# Altium integrated library Cap-El-THP_V2.IntLib: 241 symbols (part 1 of 2) (continued)
## 100uF_25V_20%
designator C?, comment value 100uF  Voltage: 25V  (hidden comment: CAP-EL_100uF_25V_20%)
Cap Electrolytic THP Radial; Manufacturer: Various; Tol: 20%; Part Number: CAP-EL_100uF_25V_20%; Package: EL-RAD-5x11; EDM-PN: *; Text2: *; Text1: *
footprint EL-RAD-5X11 (Capacitor, Electrolytic, THP, Radial, Dia 5.00mm, Pitch 2.0mm)
pins: 1, 2

## 100uF_25V_20%-EXR101M25B
designator C?, comment value 100uF  Voltage: 25V  (hidden comment: EXR101M25B)
Cap Electrolytic - Low Imp; Manufacturer: Hitano; Tol: 20%; Part Number: EXR101M25B; Package: EL-RAD-6.3x11; EDM-PN: *; Text2: *; Text1: *
footprint EL-RAD-6.3X11 (Capacitor, Electrolytic, THP, Radial, Dia 6.3mm, Pitch 2.5mm)
pins: 1, 2

## 100uF_35V_20%
designator C?, comment value 100uF  Voltage: 35V  (hidden comment: CAP-EL_100uF_35V_20%)
Cap Electrolytic THP Radial (6.3x11); Manufacturer: Various; EDM-PN: CAP32; Tol: 20%; Part Number: CAP-EL_100uF_35V_20%; Package: EL-RAD-6.3x11; Text2: *; Text1: *
footprint EL-RAD-6.3X11 (Capacitor, Electrolytic, THP, Radial, Dia 6.3mm, Pitch 2.5mm)
pins: 1, 2

## 100uF_35V_20%-6.3x12.5
designator C?, comment value 100uF  Voltage: 35V  (hidden comment: CAP-EL_100uF_35V_20% 6.3x12.5)
Cap Electrolytic THP Radial (6.3x12.5); Manufacturer: Various; Tol: 20%; Part Number: 100uF_35V_20% 6.3x12.5; Package: EL-RAD-6.3X12.5; EDM-PN: *; Text2: *; Text1: *
footprint EL-RAD-6.3X12.5 (Capacitor, Electrolytic, THP, Radial, Dia 6.3mm, Pitch 2.5mm)
pins: 1, 2

## 100uF_35V_20%-35PX100MEFC6.3X11
designator C?, comment value 100uF  Voltage: 35V  (hidden comment: 35PX100MEFC6.3X11)
Cap Electrolytic THP Radial; Manufacturer: Elna America; EDM-PN: CAP1303; Tol: 20%; Part Number: 35PX100MEFC6.3X11; Package: EL-RAD-5x11; Text2: *; Text1: *
footprint EL-RAD-6.3X11 (Capacitor, Electrolytic, THP, Radial, Dia 6.3mm, Pitch 2.5mm)
pins: 1, 2

## 100uF_35V_20%-LARGE
designator C?, comment value 100uF  Voltage: 35V  (hidden comment: CAP-EL_100uF_35V_20%)
Cap Electrolytic THP Radial (6.3x11); Manufacturer: Various; EDM-PN: CAP32; Tol: 20%; Part Number: CAP-EL_100uF_35V_20%; Package: EL-RAD-6.3X11-LARGE; Text2: *; Text1: *
footprint EL-RAD-6.3X11-LARGE (Capacitor, Electrolytic, THP, Radial, Dia 6.3mm, Pitch 2.5mm)
pins: 1, 2

## 100uF_35V_20%-RFS-35V100ME3#5
designator C13, comment value 100uF  Voltage: 35V  (hidden comment: RFS-35V100ME3#5)
Cap Electrolytic THP Radial; Manufacturer: Elna America; EDM-PN: CAP1303; Tol: 20%; Part Number: RFS-35V100ME3#5; Package: EL-RAD-5x11; Text2: *; Text1: *
footprint EL-RAD-5X11 (Capacitor, Electrolytic, THP, Radial, Dia 5.00mm, Pitch 2.0mm)
pins: 1, 2

## 100uF_35V_20%-Rt
designator C?, comment value 100uF  Voltage: 35V  (hidden comment: CAP-EL_100uF_35V_20%)
Cap Electrolytic THP Radial; Manufacturer: Various; EDM-PN: CAP32; Tol: 20%; Part Number: CAP-EL_100uF_35V_20%; Package: EL-RAD-6.3x11-RT; Text2: *; Text1: *
footprint EL-RAD-6.3X11-RT (Capacitor, Electrolytic, THP, Radial, Dia 6.3x11.0mm, Pitch 2.5mm)
pins: 1, 2

## 100uF_40V_20%-03127101E3
designator C?, comment value 100uF  Voltage: 40V  (hidden comment: 03127101E3)
Cap Electrolytic THP Axial; Manufacturer: Various; Tol: 20%; Part Number: 03127101E3; Package: EL-AX-18-08; EDM-PN: *; Text2: *; Text1: *
footprint EL-AX-18-08 (Cap El Axial 18.0x8.0mm)
pins: 1, 2

## 100uF_40V_20%-03127101E3-DNF
designator C?, comment value (100uF)  Voltage: 40V  (hidden comment: 03127101E3)
Cap Electrolytic THP Axial - Do not Fit; Manufacturer: Various; Part Number: DNF - 03127101E3; Tol: 20%; Package: EL-AX-18-08; EDM-PN: *; Text2: *; Text1: *
footprint EL-AX-18-08 (Cap El Axial 18.0x8.0mm)
pins: 1, 2

## 100uF_50V_20%-50YXF100M
designator C?, comment value 100uF  Voltage: 50V  (hidden comment: 50YXF100M)
Cap Electrolytic THP Radial - Low Imp; Manufacturer: Rubycon; Tol: 20%; Reutech PN: 5910-EL-0078; Part Number: 50YXF100M; Package: EL-RAD-8x11.5; EDM-PN: *; Text2: *; Text1: *
footprint EL-RAD-8X11.5 (Capacitor, Electrolytic, THP, Radial, Dia 8.00mm, Pitch 3.50mm)
pins: 1, 2

## 100uF_50V_20%-50YXF100M-DNF
designator C?, comment value (100uF)  Voltage: 50V  (hidden comment: 50YXF100M)
Cap Electrolytic THP Radial - Low Imp - Do not Fit; Manufacturer: Rubycon; Part Number: DNF - 50YXF100M; Tol: 20%; Package: EL-RAD-8x11.5; EDM-PN: *; Text2: *; Text1: *
footprint EL-RAD-8X11.5 (Capacitor, Electrolytic, THP, Radial, Dia 8.00mm, Pitch 3.50mm)
pins: 1, 2

## 100uF_50V_20%-50YXF100M-Rt
designator C?, comment value 100uF  Voltage: 50V  (hidden comment: 50YXF100M)
Cap Electrolytic THP Radial - Low Imp; Manufacturer: Rubycon; Tol: 20%; Reutech PN: 5910-EL-0078; Part Number: 50YXF100M; Package: EL-RAD-8x11.5; EDM-PN: *; Text2: *; Text1: *
footprint EL-RAD-8X11.5-RT (Capacitor, Electrolytic, THP, Radial, Dia 8.00mm, Pitch 3.50mm)
pins: 1, 2

## 100uF_63V_20%-MAL211818101E3
designator C?, comment value 100uF  Voltage: 63V  (hidden comment: MAL211818101E3)
Cap Electrolytic THP Radial; Manufacturer: Vishay; Tol: 20%; Part Number: MAL211818101E3; Package: EL-AX-30x15; EDM-PN: *; Text2: *; Text1: *
footprint EL-AX-30-15 (Cap El Axial 30.0x15.0mm)
pins: 1, 2

## 100uF_100V_20%-ECA2AM101
designator C?, comment value 100uF  Voltage: 100V  (hidden comment: ECA2AM101)
Cap Electrolytic THP Radial; Manufacturer: Panasonic; Tol: 20%; Part Number: ECA2AM101; Package: EL-RAD-10x16; EDM-PN: *; Text2: *; Text1: *
footprint EL-RAD-10x16 (Capacitor, Electrolytic, THP, Radial, Dia 10.00mm, Pitch 5.00mm)
pins: 1, 2

## 100uF_100V_20%-UPW2A101MHD
designator C?, comment value 100uF  Voltage: 100V  (hidden comment: UPW2A101MHD)
Cap Electrolytic THP Radial - Low Imp; Manufacturer: Nichicon; Tol: 20%; Part Number: UPW2A101MHD; Package: EL-RAD-12.5x20; EDM-PN: *; Text2: *; Text1: *; Reutech PN: *
footprint EL-RAD-12.5x20 (Capacitor, Electrolytic, THP, Radial, Dia 12.50mm, Pitch 5.00mm)
pins: 1, 2

## 100uF_100V_20%-UPW2A101MHD-Rt
designator C?, comment value 100uF  Voltage: 100V  (hidden comment: UPW2A101MHD)
Cap Electrolytic THP Radial - Low Imp; Manufacturer: Nichicon; Tol: 20%; Part Number: UPW2A101MHD; Package: EL-RAD-12.5x20-RT; EDM-PN: *; Text2: *; Text1: *; Reutech PN: *
footprint EL-RAD-12.5x20-Rt (Capacitor, Electrolytic, THP, Radial, Dia 12.50mm, Pitch 5.00mm)
pins: 1, 2

## 100uF_200V_20%-EKXJ201ELL101MJ35S
designator C?, comment value 100uF  Voltage: 200V  (hidden comment: EKXJ201ELL101MJ35S)
Cap Electrolytic THP Radial (10x35); Manufacturer: Nippon; Tol: 20%; Part Number: EKXJ201ELL101MJ35S; Package: EL-RAD-10x35; EDM-PN: *; Text2: *; Text1: *
footprint EL-RAD-10X35 (Capacitor, Electrolytic, THP, Radial, Dia 10.00mm, Pitch 5.00mm)
pins: 1, 2

## 100uF_200V_20%-EKXJ201ELL101MJ35S-Rt
designator C?, comment value 100uF  Voltage: 200V  (hidden comment: EKXJ201ELL101MJ35S)
Cap Electrolytic THP Radial (10x35); Manufacturer: Nippon; Tol: 20%; Part Number: EKXJ201ELL101MJ35S; Package: EL-RAD-10x35-RT; EDM-PN: *; Text2: *; Text1: *
footprint EL-RAD-10X35-RT (Capacitor, Electrolytic, THP, Radial, Dia 10.0mm, Pitch 5.0mm)
pins: 1, 2

## 100uF_200V_20%-EKXJ201ELL101MK25S
designator C?, comment value 100uF  Voltage: 200V  (hidden comment: EKXJ201ELL101MK25S)
Cap Electrolytic THP Radial (12.5x25); Manufacturer: Nippon; Tol: 20%; Part Number: EKXJ201ELL101MK25S; Package: EL-RAD-12.5x25; EDM-PN: *; Text2: *; Text1: *
footprint EL-RAD-12.5x25 (Capacitor, Electrolytic, THP, Radial, Dia 12.50mm, Pitch 5.00mm)
pins: 1, 2

## 100uF_200V_20%-EKXJ201ELL101MK25S-Rt
designator C?, comment value 100uF  Voltage: 200V  (hidden comment: EKXJ201ELL101MK25S)
Cap Electrolytic THP Radial (12.5x25); Manufacturer: Nippon; Tol: 20%; Part Number: EKXJ201ELL101MK25S; Package: EL-RAD-12.5x25-RT; EDM-PN: *; Text2: *; Text1: *
footprint EL-RAD-12.5x25-RT (Capacitor, Electrolytic, THP, Radial, Dia 12.50mm, Pitch 5.00mm)
pins: 1, 2

## 100uF_250V_20%-250PK100MEFC16X25
designator C?, comment value 100uF  Voltage: 250V  (hidden comment: 250PK100MEFC16X25)
Cap Electrolytic THP Radial (16x25); Manufacturer: Rubycon; Tol: 20%; Part Number: 250PK100MEFC16X25; Package: EL-RAD-16x25; EDM-PN: *; Text2: *; Text1: *
footprint EL-RAD-16x25 (Capacitor, Electrolytic, THP, Radial, Dia 16.0mm, Pitch 7.50mm)
pins: 1, 2

## 100uF_250V_20%-250PK100MEFC16X25-Rt
designator C?, comment value 100uF  Voltage: 250V  (hidden comment: 250PK100MEFC16X25)
Cap Electrolytic THP Radial (16x25); Manufacturer: Rubycon; Tol: 20%; Part Number: 250PK100MEFC16X25; Package: EL-RAD-16x25-RT; EDM-PN: *; Text2: *; Text1: *
footprint EL-RAD-16x25-RT (Capacitor, Electrolytic, THP, Radial, Dia 16.0mm, Pitch 5.00mm)
pins: 1, 2

## 100uF_250V_20%-250PK100MEFC16X25-Rt-Rev
designator C?, comment value 100uF  Voltage: 250V  (hidden comment: 250PK100MEFC16X25)
Cap Electrolytic THP Radial (16x25); Manufacturer: Rubycon; Tol: 20%; Part Number: 250PK100MEFC16X25; Package: EL-RAD-16x25-RT-Rev; EDM-PN: *; Text2: *; Text1: *
footprint EL-RAD-16x25-RT-REV (Capacitor, Electrolytic, THP, Radial, Dia 16.0mm, Pitch 5.00mm)
pins: 1, 2

## 100uF_250V_20%-EEU-ED2E101S
designator C?, comment value 100uF  Voltage: 250V  (hidden comment: EEU-ED2E101S)
Cap Electrolytic THP Radial (18x25); Manufacturer: Panasonic; Tol: 20%; Part Number: EEU-ED2E101S; Package: EL-RAD-18x25; EDM-PN: *; Text2: *; Text1: *
footprint EL-RAD-18x25 (Capacitor, Electrolytic, THP, Radial, Dia 18.00mm, Pitch 7.50mm)
pins: 1, 2

## 100uF_250V_20%-EEU-ED2E101S-SIL
designator C?, comment value 100uF  Voltage: 250V  (hidden comment: EEU-ED2E101S)
Cap Electrolytic THP Radial (18x25) and SIL2P; Manufacturer: Panasonic; Tol: 20%; Part Number: EEU-ED2E101S; Package: CAP-SIL2P-2.54; EDM-PN: *; Text2: *; Text1: *
footprint CAP-SIL2P-2.54 (SIL Strip 2.54mm)
pins: 1, 2

## 100uF_250V_20%-EEU-ED2E101S-SIL-5.08
designator C?, comment value 100uF  Voltage: 250V  (hidden comment: EEU-ED2E101S)
Cap Electrolytic THP Radial (18x25) and SIL3P; Manufacturer: Panasonic; Tol: 20%; Part Number: EEU-ED2E101S; Package: CAP-SIL2P-5.08; EDM-PN: *; Text2: *; Text1: *
footprint CAP-SIL2P-5.08 (SIL Strip 5.08mm)
pins: 1, 2

## 150uF_450V_20%-PEH536YBF3150M3
designator C?, comment value 150uF  Voltage: 450V  (hidden comment: PEH536YBF3150M3)
Cap Electrolytic THP Radial; Manufacturer: Kemet; Tol: 20%; Part Number: PEH536YBF3150M3; Package: EL-RAD-25x45-3PIN; EDM-PN: *; Text2: *; Text1: *
footprint EL-RAD-25x45-3PIN (Capacitor, Electrolytic, THP, 25x45mm)
pins: 1, 2

## 150uF_450V_20%-PEH536YBF3150M3-Rt
designator C?, comment value 150uF  Voltage: 450V  (hidden comment: PEH536YBF3150M3)
Cap Electrolytic THP Radial; Manufacturer: Kemet; Tol: 20%; Part Number: PEH536YBF3150M3; Package: EL-RAD-18x35.5-Rt; EDM-PN: *; Text2: *; Text1: *
footprint EL-RAD-18x35.5-Rt (Capacitor, Electrolytic, THP, Radial, Dia 18.00mm, Pitch 7.50mm)
pins: 1, 2

## 220uF_16V_20%
designator C?, comment value 220uF  Voltage: 16V  (hidden comment: CAP-EL_220uF_16V_20%)
Cap Electrolytic THP Radial (6.3x12.5mm); Manufacturer: Various; Part Number: 220uF 16V 20% (6.3x12.5); Tol: 20%; Package: EL-RAD-6.3x12.5; EDM-PN: *; Text2: *; Text1: *
footprint EL-RAD-6.3X12.5 (Capacitor, Electrolytic, THP, Radial, Dia 6.3mm, Pitch 2.5mm)
pins: 1, 2

## 220uF_16V_20%-UFW1C221MED
designator C?, comment value 220uF  Voltage: 16V  (hidden comment: UFW1C221MED)
Cap Electrolytic THP Radial (6.3x11mm); Manufacturer: Nichicon; Tol: 20%; Part Number: UFW1C221MED; Package: EL-RAD-6.3x11; EDM-PN: *; Text2: *; Text1: *
footprint EL-RAD-6.3X11 (Capacitor, Electrolytic, THP, Radial, Dia 6.3mm, Pitch 2.5mm)
pins: 1, 2

## 220uF_16V_20%-UPW1C221MPD1TD
designator C?, comment value 220uF  Voltage: 16V  (hidden comment: UPW1C221MPD1TD)
Cap Electrolytic THP Radial (8x13mm) Low Imp; Manufacturer: Nichicon; Tol: 20%; Part Number: UPW1C221MPD1TD; Package: EL-RAD-8X13.5-Black-RT; EDM-PN: *; Text2: *; Text1: *
footprint EL-RAD-8X13.5-Black (Capacitor, Electrolytic, THP, Radial, Dia 8.00mm, Pitch 3.50mm)
pins: 1, 2

## 220uF_16V_20%-UPW1C221MPD1TD-Rt
designator C?, comment value 220uF  Voltage: 16V  (hidden comment: UPW1C221MPD1TD)
Cap Electrolytic THP Radial (8x13mm) Low Imp; Manufacturer: Nichicon; Tol: 20%; Part Number: UPW1C221MPD1TD; Package: EL-RAD-8X13.5-Black-RT; EDM-PN: *; Text2: *; Text1: *
footprint EL-RAD-8X13.5-Black-RT (Capacitor, Electrolytic, THP, Radial, Dia 8.00mm, Pitch 3.50mm)
pins: 1, 2

## 220uF_25V_20%
designator C?, comment value 220uF  Voltage: 25V  (hidden comment: CAP-EL_220uF_25V_20%)
Cap Electrolytic THP Radial; Manufacturer: Various; Tol: 20%; Part Number: CAP-EL_220uF_25V_20%; Package: EL-RAD-6.3x11; EDM-PN: *; Text2: *; Text1: *
footprint EL-RAD-6.3X11 (Capacitor, Electrolytic, THP, Radial, Dia 6.3mm, Pitch 2.5mm)
pins: 1, 2

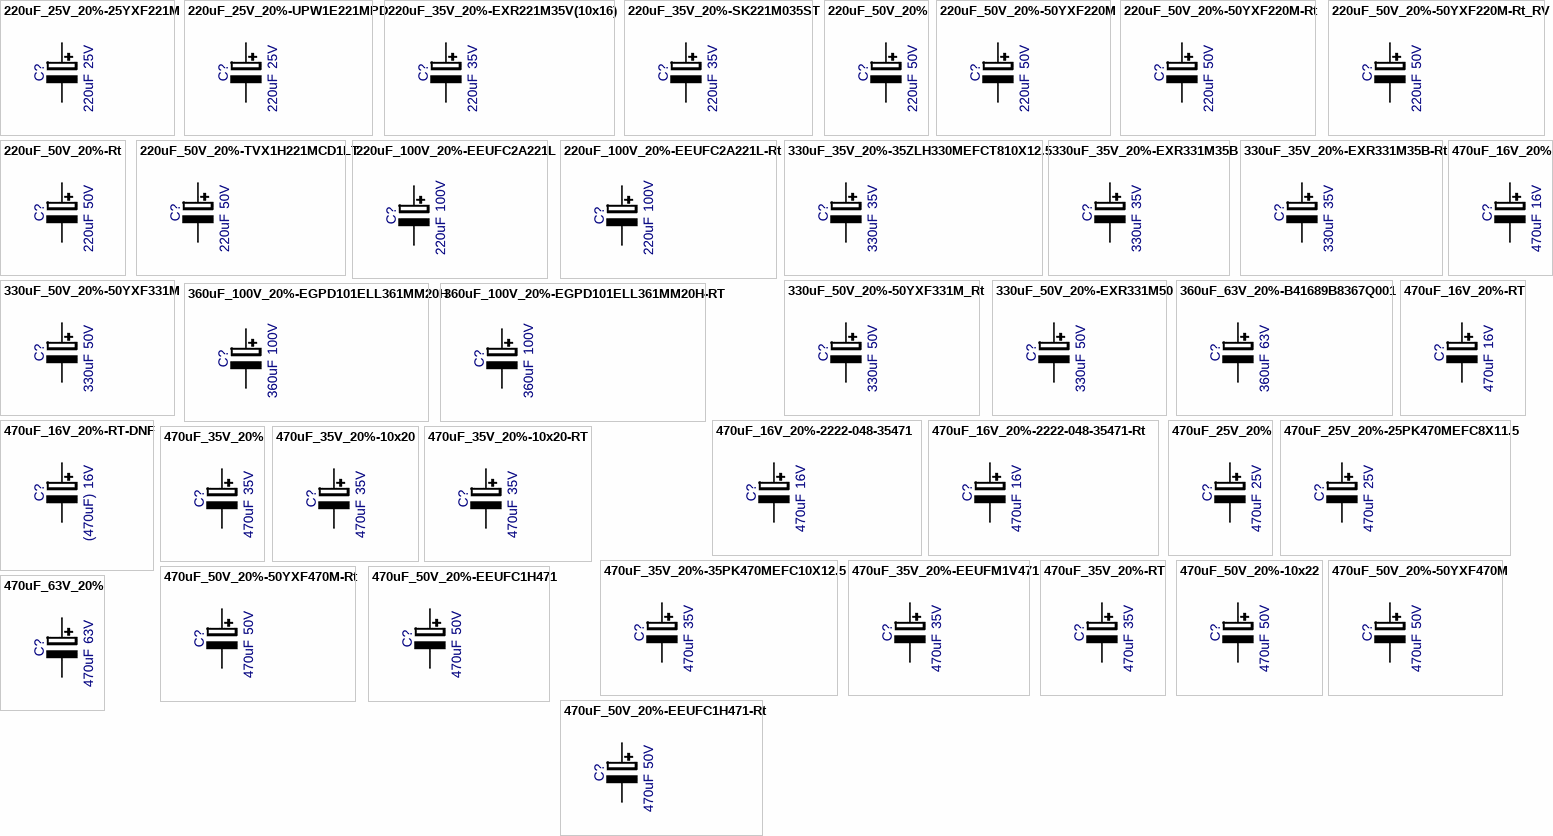
[diagram p3: symbols 220uF_25V_20%-25YXF221M to 470uF_63V_20%]

## 220uF_25V_20%-25YXF221M
designator C?, comment value 220uF  Voltage: 25V  (hidden comment: 25YXF221M)
Cap Electrolytic THP Radial - Low Imp; Manufacturer: Rubycon; Tol: 20%; Part Number: 25YXF221M; Package: EL-RAD-8X11.5; EDM-PN: *; Text2: *; Text1: *
footprint EL-RAD-8X11.5 (Capacitor, Electrolytic, THP, Radial, Dia 8.00mm, Pitch 3.50mm)
pins: 1, 2

## 220uF_25V_20%-UPW1E221MPD
designator C?, comment value 220uF  Voltage: 25V  (hidden comment: UPW1E221MPD)
Cap Electrolytic THP Radial - Low Imp; Manufacturer: Nichicon; EDM-PN: CAP61; Tol: 20%; Part Number: UPW1E221MPD; Package: EL-RAD-8X11.5; Text2: *; Text1: *
footprint EL-RAD-8X11.5 (Capacitor, Electrolytic, THP, Radial, Dia 8.00mm, Pitch 3.50mm)
pins: 1, 2

## 220uF_35V_20%-EXR221M35V(10x16)
designator C?, comment value 220uF  Voltage: 35V  (hidden comment: EXR221M35V(10x16))
Cap Electrolytic THP Radial - Low Imp; Manufacturer: Hitano; Tol: 20%; Part Number: EXR221M35V(10x16); Package: EL-RAD-10x16; EDM-PN: *; Text2: *; Text1: *
footprint EL-RAD-10x16 (Capacitor, Electrolytic, THP, Radial, Dia 10.00mm, Pitch 5.00mm)
pins: 1, 2

## 220uF_35V_20%-SK221M035ST
designator C?, comment value 220uF  Voltage: 35V  (hidden comment: SK221M035ST)
Cap Electrolytic THP Radial; Manufacturer: MALLORY; Tol: 20%; Part Number: SK221M035ST; Package: EL-RAD-10x13; EDM-PN: *; Text2: *; Text1: *
footprint EL-RAD-10X13 (Capacitor, Electrolytic, THP, Radial, Dia 10.00mm, Pitch 5.00mm)
pins: 1, 2

## 220uF_50V_20%
designator C?, comment value 220uF  Voltage: 50V  (hidden comment: CAP-EL_220uF_50V_20%)
Cap Electrolytic THP Radial; Manufacturer: Various; Part Number: 220uF 16V 20% (10x16); Tol: 20%; Package: EL-RAD-10x16; EDM-PN: *; Text2: *; Text1: *; Reutech PN: *
footprint EL-RAD-10X16 (Capacitor, Electrolytic, THP, Radial, Dia 10.00mm, Pitch 5.00mm)
pins: 1, 2

## 220uF_50V_20%-50YXF220M
designator C?, comment value 220uF  Voltage: 50V  (hidden comment: 50YXF220M)
Cap Electrolytic THP Radial - Low Imp; Manufacturer: Rubycon; Tol: 20%; Reutech PN: 5910-EL-0076; Part Number: 50YXF220M; Package: EL-RAD-10x16; EDM-PN: *; Text2: *; Text1: *
footprint EL-RAD-10X16 (Capacitor, Electrolytic, THP, Radial, Dia 10.00mm, Pitch 5.00mm)
pins: 1, 2

## 220uF_50V_20%-50YXF220M-Rt
designator C?, comment value 220uF  Voltage: 50V  (hidden comment: 50YXF220M)
Cap Electrolytic THP Radial - Low Imp; Manufacturer: Rubycon; Tol: 20%; Reutech PN: 5910-EL-0076; Part Number: 50YXF220M; Package: EL-RAD-10x16-RT; EDM-PN: *; Text2: *; Text1: *
footprint EL-RAD-10X16-RT (Capacitor, Electrolytic, THP, Radial, Dia 10.00mm, Pitch 5.00mm)
pins: 1, 2

## 220uF_50V_20%-50YXF220M-Rt_RV
designator C?, comment value 220uF  Voltage: 50V  (hidden comment: 50YXF220M)
Cap Electrolytic THP Radial - Low Imp; Manufacturer: Rubycon; Tol: 20%; Reutech PN: 5910-EL-0076; Part Number: 50YXF220M; Package: EL-RAD-10x16-RT-RV; EDM-PN: *; Text2: *; Text1: *
footprint EL-RAD-10X16-RT-RV (Capacitor, Electrolytic, THP, Radial, Dia 10.00mm, Pitch 5.00mm)
pins: 1, 2

## 220uF_50V_20%-Rt
designator C?, comment value 220uF  Voltage: 50V  (hidden comment: CAP-EL_220uF_50V_20%)
Cap Electrolytic THP Radial; Manufacturer: Various; Part Number: 220uF 16V 20% (10x16); Tol: 20%; Package: EL-RAD-10x16-RT; EDM-PN: *; Text2: *; Text1: *; Reutech PN: *
footprint EL-RAD-10X16-RT (Capacitor, Electrolytic, THP, Radial, Dia 10.00mm, Pitch 5.00mm)
pins: 1, 2

## 220uF_50V_20%-TVX1H221MCD1LT
designator C?, comment value 220uF  Voltage: 50V  (hidden comment: TVX1H221MCD1LT)
Cap Electrolytic THP Axial (21x10mm); Manufacturer: Nichicon; Tol: 20%; Part Number: TVX1H221MCD1LT; Package: EL-AX-21x10; EDM-PN: *; Text2: *; Text1: *
footprint EL-AX-21-10 (Cap El Axial 21.0x10.0mm)
pins: 1, 2

## 220uF_100V_20%-EEUFC2A221L
designator C?, comment value 220uF  Voltage: 100V  (hidden comment: EEUFC2A221L)
Cap Electrolytic THP Radial; Manufacturer: Panasonic; Tol: 20%; Reutech PN: 5910-EL-0187; Part Number: EEUFC2A221L; Package: EL-RAD-12.5x35; EDM-PN: *; Text2: *; Text1: *
footprint EL-RAD-12.5x35 (Capacitor, Electrolytic, THP, Radial, Dia 12.50mm, Pitch 5.00mm)
pins: 1, 2

## 220uF_100V_20%-EEUFC2A221L-Rt
designator C?, comment value 220uF  Voltage: 100V  (hidden comment: EEUFC2A221L)
Cap Electrolytic THP Radial; Manufacturer: Panasonic; Tol: 20%; Reutech PN: 5910-EL-0187; Part Number: EEUFC2A221L; Package: EL-RAD-12.5x35-Rt; EDM-PN: *; Text2: *; Text1: *
footprint EL-RAD-12.5x35-RT (Capacitor, Electrolytic, THP, Radial, Dia 12.50mm, Pitch 5.00mm)
pins: 1, 2

## 330uF_35V_20%-35ZLH330MEFCT810X12.5
designator C?, comment value 330uF  Voltage: 35V  (hidden comment: 35ZLH330MEFCT810X12.5)
Cap Electrolytic THP Radial low ESR; Manufacturer: Rubycon; Tol: 20%; Part Number: 35ZLH330MEFCT810X12.5; Package: EL-RAD-10x13; EDM-PN: *; Text2: *; Text1: *
footprint EL-RAD-10X13 (Capacitor, Electrolytic, THP, Radial, Dia 10.00mm, Pitch 5.00mm)
pins: 1, 2

## 330uF_35V_20%-EXR331M35B
designator C?, comment value 330uF  Voltage: 35V  (hidden comment: EXR331M35B)
Cap Electrolytic THP Radial - Low Imp; Manufacturer: Hitano; Tol: 20%; Part Number: EXR331M35B; Package: EL-RAD-10x16; EDM-PN: *; Text2: *; Text1: *
footprint EL-RAD-10X16 (Capacitor, Electrolytic, THP, Radial, Dia 10.00mm, Pitch 5.00mm)
pins: 1, 2

## 330uF_35V_20%-EXR331M35B-Rt
designator C?, comment value 330uF  Voltage: 35V  (hidden comment: EXR331M35B)
Cap Electrolytic THP Radial - Low Imp; Manufacturer: Hitano; Tol: 20%; Part Number: EXR331M35B; Package: EL-RAD-10x16-RT; EDM-PN: *; Text2: *; Text1: *
footprint EL-RAD-10X16-RT (Capacitor, Electrolytic, THP, Radial, Dia 10.00mm, Pitch 5.00mm)
pins: 1, 2

## 330uF_50V_20%-50YXF331M
designator C?, comment value 330uF  Voltage: 50V  (hidden comment: 50YXF331M)
Cap Electrolytic THP Radial - Low Imp; Manufacturer: Rubycon; Tol: 20%; Reutech PN: 5910-EL-0170; Part Number: 50YXF331M; Package: EL-RAD-10x20; EDM-PN: *; Text2: *; Text1: *
footprint EL-RAD-10X20 (Capacitor, Electrolytic, THP, Radial, Dia 10.00mm, Pitch 5.00mm)
pins: 1, 2

## 330uF_50V_20%-50YXF331M_Rt
designator C?, comment value 330uF  Voltage: 50V  (hidden comment: 50YXF331M)
Cap Electrolytic THP Radial - Low Imp; Manufacturer: Rubycon; Tol: 20%; Reutech PN: 5910-EL-0170; Part Number: 50YXF331M; Package: EL-RAD-10x20; EDM-PN: *; Text2: *; Text1: *
footprint EL-RAD-10X20-RT (Capacitor, Electrolytic, THP, Radial, Dia 10.0mm, Pitch 5.0mm)
pins: 1, 2

## 330uF_50V_20%-EXR331M50
designator C?, comment value 330uF  Voltage: 50V  (hidden comment: EXR331M50)
Cap Electrolytic THP Radial - Low Imp; Manufacturer: Hitano; Tol: 20%; Part Number: EXR331M50; Package: EL-RAD-10x20; EDM-PN: *; Text2: *; Text1: *
footprint EL-RAD-10X20 (Capacitor, Electrolytic, THP, Radial, Dia 10.00mm, Pitch 5.00mm)
pins: 1, 2

## 360uF_63V_20%-B41689B8367Q001
designator C?, comment value 360uF  Voltage: 63V  (hidden comment: B41689B8367Q001)
Cap Electrolytic THP Axial Low ESR; Manufacturer: TDK; Tol: 20%; Reutech PN: 5910-EL-0188; Part Number: B41689B8367Q001; Package: EL-RAD-16x25-Axial; EDM-PN: *; Text2: *; Text1: *
footprint EL-RAD-16x25-Axial (Electrolytic, THP, Axial 16.0x25.0mm)
pins: 1, 2

## 360uF_100V_20%-EGPD101ELL361MM20H
designator C?, comment value 360uF  Voltage: 100V  (hidden comment: EGPD101ELL361MM20H)
Cap Electrolytic High Ripple Current, GPD Series; Manufacturer: Nippon; Tol: 20%; Reutech PN: 5910-EL-0189; Part Number: EGPD101ELL361MM20H; Package: EL-RAD-18x20; EDM-PN: *; Text2: *; Text1: *
footprint EL-RAD-18x20 (Capacitor, Electrolytic, THP, Radial, Dia 18.00mm, Pitch 7.50mm)
pins: 1, 2

## 360uF_100V_20%-EGPD101ELL361MM20H-RT
designator C?, comment value 360uF  Voltage: 100V  (hidden comment: EGPD101ELL361MM20H)
Cap Electrolytic High Ripple Current, GPD Series; Manufacturer: Nippon; Tol: 20%; Reutech PN: 5910-EL-0189; Part Number: EGPD101ELL361MM20H; Package: EL-RAD-18x20-RT; EDM-PN: *; Text2: *; Text1: *
footprint EL-RAD-18x20-Rt (Capacitor, Electrolytic, THP, Radial, Dia 18.00mm, Pitch 7.50mm)
pins: 1, 2

## 470uF_16V_20%
designator C?, comment value 470uF  Voltage: 16V  (hidden comment: CAP-EL_470uF_16V_20%)
Cap Electrolytic THP Radial; Manufacturer: Various; EDM-PN: CAP46; Tol: 20%; Part Number: CAP-EL_470uF_16V_20%; Package: EL-RAD-8x11.5; Text2: *; Text1: *
footprint EL-RAD-8X11.5 (Capacitor, Electrolytic, THP, Radial, Dia 8.00mm, Pitch 3.50mm)
pins: 1, 2

## 470uF_16V_20%-2222-048-35471
designator C?, comment value 470uF  Voltage: 16V  (hidden comment: 2222-048-35471)
Cap Electrolytic THP Radial Long Life; Manufacturer: Vishay/BC Comp; Tol: 20%; Part Number: 2222-048-35471; Package: EL-RAD-10x13; EDM-PN: *; Text2: *; Text1: *
footprint EL-RAD-10X13 (Capacitor, Electrolytic, THP, Radial, Dia 10.00mm, Pitch 5.00mm)
pins: 1, 2

## 470uF_16V_20%-2222-048-35471-Rt
designator C?, comment value 470uF  Voltage: 16V  (hidden comment: 2222-048-35471)
Cap Electrolytic THP Radial Long Life; Manufacturer: Vishay/BC Comp; Tol: 20%; Part Number: 2222-048-35471; Package: EL-RAD-10x13-Rt; EDM-PN: *; Text2: *; Text1: *
footprint EL-RAD-10X13-RT (Capacitor, Electrolytic, THP, Radial, Dia 10.00mm, Pitch 5.00mm)
pins: 1, 2

## 470uF_16V_20%-RT
designator C?, comment value 470uF  Voltage: 16V  (hidden comment: CAP-EL_470uF_16V_20%)
Cap Electrolytic THP Radial; Manufacturer: Various; EDM-PN: CAP46; Tol: 20%; Part Number: CAP-EL_470uF_16V_20%; Package: EL-RAD-8X11.5-RT; Text2: *; Text1: *
footprint EL-RAD-8X11.5-RT (Capacitor, Electrolytic, THP, Radial, Dia 8.00mm, Pitch 3.50mm)
pins: 1, 2

## 470uF_16V_20%-RT-DNF
designator C?, comment value (470uF)  Voltage: 16V  (hidden comment: CAP-EL_470uF_16V_20%)
Cap Electrolytic THP Radial - Do not Fit; Manufacturer: Various; Part Number: DNF - CAP-EL_470uF_16V_20%; EDM-PN: CAP46; Tol: 20%; Package: EL-RAD-8X11.5-RT; Text2: *; Text1: *
footprint EL-RAD-8X11.5-RT (Capacitor, Electrolytic, THP, Radial, Dia 8.00mm, Pitch 3.50mm)
pins: 1, 2

## 470uF_25V_20%
designator C?, comment value 470uF  Voltage: 25V  (hidden comment: CAP-EL_470uF_25V_20%)
Cap Electrolytic THP Radial; Manufacturer: Various; Tol: 20%; Part Number: CAP-EL_470uF_25V_20%; Package: EL-RAD-10x13; EDM-PN: *; Text2: *; Text1: *
footprint EL-RAD-10X13 (Capacitor, Electrolytic, THP, Radial, Dia 10.00mm, Pitch 5.00mm)
pins: 1, 2

## 470uF_25V_20%-25PK470MEFC8X11.5
designator C?, comment value 470uF  Voltage: 25V  (hidden comment: 25PK470MEFC8X11.5)
Cap Electrolytic THP Radial; Manufacturer: Rubycon; Tol: 20%; Part Number: 25PK470MEFC8X11.5; Package: EL-RAD-8x11.5; EDM-PN: *; Text2: *; Text1: *
footprint EL-RAD-8X11.5 (Capacitor, Electrolytic, THP, Radial, Dia 8.00mm, Pitch 3.50mm)
pins: 1, 2

## 470uF_35V_20%
designator C?, comment value 470uF  Voltage: 35V  (hidden comment: CAP-EL_470uF_35V_20%)
Cap Electrolytic THP Radial; Manufacturer: Various; EDM-PN: CAP195; Tol: 20%; Part Number: CAP-EL_470uF_35V_20%; Package: EL-RAD-10x16; Text2: *; Text1: *
footprint EL-RAD-10X16 (Capacitor, Electrolytic, THP, Radial, Dia 10.00mm, Pitch 5.00mm)
pins: 1, 2

## 470uF_35V_20%-10x20
designator C?, comment value 470uF  Voltage: 35V  (hidden comment: CAP-EL_470uF_35V_20%)
Cap Electrolytic THP Radial; Manufacturer: Various; Part Number: CAP-EL_470uF_35V_20% 10x20; EDM-PN: CAP121; Tol: 20%; Package: EL-RAD-10x20; Text2: *; Text1: *
footprint EL-RAD-10X20 (Capacitor, Electrolytic, THP, Radial, Dia 10.00mm, Pitch 5.00mm)
pins: 1, 2

## 470uF_35V_20%-10x20-RT
designator C?, comment value 470uF  Voltage: 35V  (hidden comment: CAP-EL_470uF_35V_20%)
Cap Electrolytic THP Radial; Manufacturer: Various; Part Number: CAP-EL_470uF_35V_20% 10x20; EDM-PN: CAP121; Tol: 20%; Package: EL-RAD-10x20-RT; Text2: *; Text1: *
footprint EL-RAD-10X20-RT (Capacitor, Electrolytic, THP, Radial, Dia 10.0mm, Pitch 5.0mm)
pins: 1, 2

## 470uF_35V_20%-35PK470MEFC10X12.5
designator C?, comment value 470uF  Voltage: 35V  (hidden comment: 35PK470MEFC10X12.5)
Cap Electrolytic THP Radial; Manufacturer: Rubycon; Tol: 20%; Part Number: 35PK470MEFC10X12.5; Package: EL-RAD-10x13; EDM-PN: *; Text2: *; Text1: *
footprint EL-RAD-10X13 (Capacitor, Electrolytic, THP, Radial, Dia 10.00mm, Pitch 5.00mm)
pins: 1, 2

## 470uF_35V_20%-EEUFM1V471
designator C?, comment value 470uF  Voltage: 35V  (hidden comment: CAP-EL_470uF_35V_20%)
Cap Electrolytic THP Radial; Manufacturer: Panasonic; Part Number: EEUFM1V471; Tol: 20%; Package: EL-RAD-10x20; EDM-PN: *; Text2: *; Text1: *
footprint EL-RAD-10X20 (Capacitor, Electrolytic, THP, Radial, Dia 10.00mm, Pitch 5.00mm)
pins: 1, 2

## 470uF_35V_20%-RT
designator C?, comment value 470uF  Voltage: 35V  (hidden comment: CAP-EL_470uF_35V_20%)
Cap Electrolytic THP Radial; Manufacturer: Various; EDM-PN: CAP195; Tol: 20%; Part Number: CAP-EL_470uF_35V_20%; Package: EL-RAD-10x16-RT; Text2: *; Text1: *
footprint EL-RAD-10X16-RT (Capacitor, Electrolytic, THP, Radial, Dia 10.00mm, Pitch 5.00mm)
pins: 1, 2

## 470uF_50V_20%-10x22
designator C?, comment value 470uF  Voltage: 50V  (hidden comment: CAP-EL_470uF_50V_20%)
Cap Electrolytic THP Radial (10x22mm); Manufacturer: Various; Part Number: CAP-EL_470uF_50V_20% 10x22; Tol: 20%; Package: EL-RAD-10x22; EDM-PN: *; Text2: *; Text1: *
footprint EL-RAD-10X22 (Capacitor, Electrolytic, THP, Radial, Dia 10.00mm, Pitch 5.00mm)
pins: 1, 2

## 470uF_50V_20%-50YXF470M
designator C?, comment value 470uF  Voltage: 50V  (hidden comment: 50YXF470M)
Cap Electrolytic THP Radial - Low Imp; Manufacturer: Rubycon; Tol: 20%; Reutech PN: 5910-EL-0067; Part Number: 50YXF470M; Package: EL-RAD-12.5x20; EDM-PN: *; Text2: *; Text1: *
footprint EL-RAD-12.5x20 (Capacitor, Electrolytic, THP, Radial, Dia 12.50mm, Pitch 5.00mm)
pins: 1, 2

## 470uF_50V_20%-50YXF470M-Rt
designator C?, comment value 470uF  Voltage: 50V  (hidden comment: 50YXF470M)
Cap Electrolytic THP Radial - Low Imp; Manufacturer: Rubycon; Tol: 20%; Reutech PN: 5910-EL-006; Part Number: 50YXF470M; Package: EL-RAD-12.5x20; EDM-PN: *; Text2: *; Text1: *
footprint EL-RAD-12.5x20-Rt (Capacitor, Electrolytic, THP, Radial, Dia 12.50mm, Pitch 5.00mm)
pins: 1, 2

## 470uF_50V_20%-EEUFC1H471
designator C?, comment value 470uF  Voltage: 50V  (hidden comment: EEUFC1H471)
Cap Electrolytic THP Radial; Manufacturer: Panasonic; Tol: 20%; Part Number: EEUFC1H471; Package: EL-RAD-12.5x25; EDM-PN: *; Text2: *; Text1: *
footprint EL-RAD-12.5x25 (Capacitor, Electrolytic, THP, Radial, Dia 12.50mm, Pitch 5.00mm)
pins: 1, 2

## 470uF_50V_20%-EEUFC1H471-Rt
designator C?, comment value 470uF  Voltage: 50V  (hidden comment: EEUFC1H471)
Cap Electrolytic THP Radial; Manufacturer: Panasonic; Tol: 20%; Part Number: EEUFC1H471; Package: EL-RAD-12.5x25-RT; EDM-PN: *; Text2: *; Text1: *
footprint EL-RAD-12.5x25-RT (Capacitor, Electrolytic, THP, Radial, Dia 12.50mm, Pitch 5.00mm)
pins: 1, 2

## 470uF_63V_20%
designator C?, comment value 470uF  Voltage: 63V  (hidden comment: CAP-EL_470uF_63V_20%)
Cap Electrolytic THP Radial; Manufacturer: Various; Part Number: EL. 470uF 63V 20%; Tol: 20%; Package: EL-RAD-12.5x20; EDM-PN: *; Text2: *; Text1: *
footprint EL-RAD-12.5x20 (Capacitor, Electrolytic, THP, Radial, Dia 12.50mm, Pitch 5.00mm)
pins: 1, 2

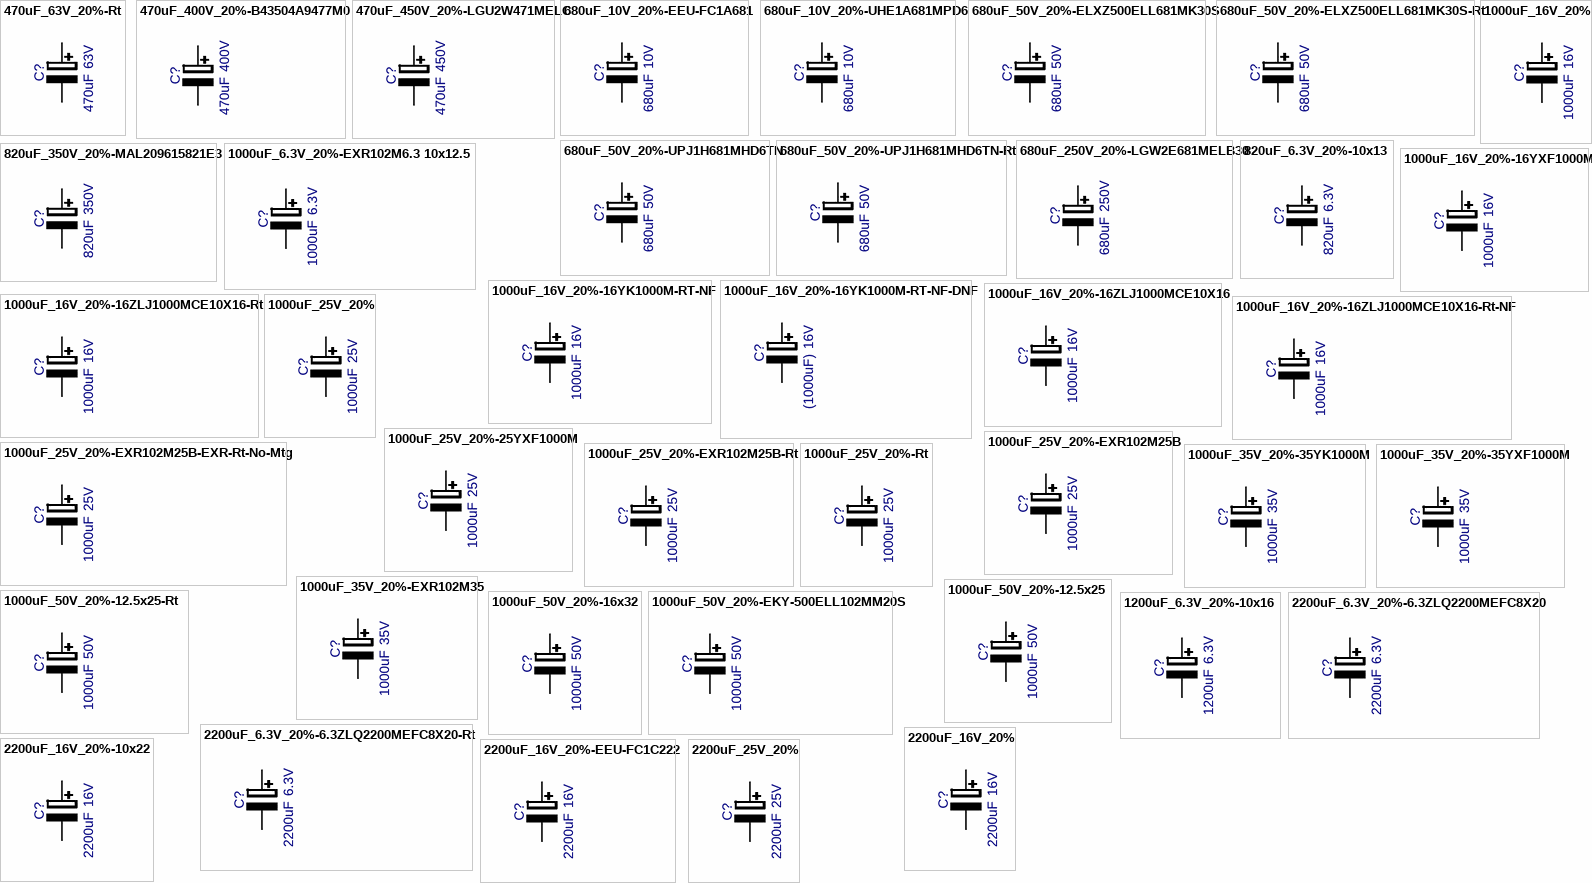
[diagram p4: symbols 470uF_63V_20%-Rt to 2200uF_25V_20%]

## 470uF_63V_20%-Rt
designator C?, comment value 470uF  Voltage: 63V  (hidden comment: CAP-EL_470uF_63V_20%-Rt)
Cap Electrolytic THP Radial; Manufacturer: Various; Part Number: EL. 470uF 63V 20%; Tol: 20%; Package: EL-RAD-12.5x20-Rt; EDM-PN: *; Text2: *; Text1: *
footprint EL-RAD-12.5x20-Rt (Capacitor, Electrolytic, THP, Radial, Dia 12.50mm, Pitch 5.00mm)
pins: 1, 2

## 470uF_400V_20%-B43504A9477M0
designator C?, comment value 470uF  Voltage: 400V  (hidden comment: B43504A9477M0)
Cap Electrolytic THP Radial Snap-In; Manufacturer: Epcos (TDK); Tol: 20%; Part Number: B43504A9477M0; Package: EL-RAD-35x45-3PIN; EDM-PN: *; Text2: *; Text1: *
footprint EL-RAD-35x45-3PIN (Capacitor, Electrolytic, THP, 35x45mm)
pins: 1, 2

## 470uF_450V_20%-LGU2W471MELC
designator C?, comment value 470uF  Voltage: 450V  (hidden comment: LGU2W471MELC)
Cap Electrolytic THP Radial Snap-In; Manufacturer: Nichicon; Tol: 20%; Part Number: LGU2W471MELC; Package: EL-RAD-35x50-2PIN-SNAP-IN; EDM-PN: *; Text2: *; Text1: *
footprint EL-RAD-35x50-2PIN-SNAP-IN (Capacitor, Electrolytic, THP, 35x50mm)
pins: 1, 2

## 680uF_10V_20%-EEU-FC1A681
designator C?, comment value 680uF  Voltage: 10V  (hidden comment: EEU-FC1A681)
Cap Electrolytic THP Radial; Manufacturer: Panasonic; Tol: 20%; Part Number: EEU-FC1A681; Package: EL-RAD-10x13; EDM-PN: *; Text2: *; Text1: *
footprint EL-RAD-10X13 (Capacitor, Electrolytic, THP, Radial, Dia 10.00mm, Pitch 5.00mm)
pins: 1, 2

## 680uF_10V_20%-UHE1A681MPD6
designator C?, comment value 680uF  Voltage: 10V  (hidden comment: UHE1A681MPD6)
Cap Electrolytic THP Radial Low Imp; Manufacturer: Nichicon; Tol: 20%; Part Number: UHE1A681MPD6; Package: EL-RAD-10x13; EDM-PN: *; Text2: *; Text1: *
footprint EL-RAD-10X13 (Capacitor, Electrolytic, THP, Radial, Dia 10.00mm, Pitch 5.00mm)
pins: 1, 2

## 680uF_50V_20%-ELXZ500ELL681MK30S
designator C?, comment value 680uF  Voltage: 50V  (hidden comment: ELXZ500ELL681MK30S)
Cap Electrolytic THP Radial (12.5x31.5); Manufacturer: United Chemi-Con; Tol: 20%; Part Number: ELXZ500ELL681MK30S; Package: EL-RAD-12.5x31.5; EDM-PN: *; Text2: *; Text1: *
footprint EL-RAD-12.5x31.5 (Capacitor, Electrolytic, THP, Radial, Dia 12.50mm, Pitch 5.00mm)
pins: 1, 2

## 680uF_50V_20%-ELXZ500ELL681MK30S-Rt
designator C?, comment value 680uF  Voltage: 50V  (hidden comment: ELXZ500ELL681MK30S)
Cap Electrolytic THP Radial (12.5x31.5); Manufacturer: United Chemi-Con; Tol: 20%; Part Number: ELXZ500ELL681MK30S; Package: EL-RAD-12.5x31.5-RT; EDM-PN: *; Text2: *; Text1: *
footprint EL-RAD-12.5x31.5-RT (Capacitor, Electrolytic, THP, Radial, Dia 12.50mm, Pitch 5.00mm)
pins: 1, 2

## 680uF_50V_20%-UPJ1H681MHD6TN
designator C?, comment value 680uF  Voltage: 50V  (hidden comment: UPJ1H681MHD6TN)
Cap Electrolytic THP Radial (16x21.5); Manufacturer: Nichicon; Tol: 20%; Part Number: UPJ1H681MHD6TN; Package: EL-RAD-16x21.5; EDM-PN: *; Text2: *; Text1: *
footprint EL-RAD-16x21.5 (Capacitor, Electrolytic, THP, Radial, Dia 16.0mm, Pitch 7.50mm)
pins: 1, 2

## 680uF_50V_20%-UPJ1H681MHD6TN-Rt
designator C?, comment value 680uF  Voltage: 50V  (hidden comment: UPJ1H681MHD6TN)
Cap Electrolytic THP Radial (16x21.5); Manufacturer: Nichicon; Tol: 20%; Part Number: UPJ1H681MHD6TN; Package: EL-RAD-16x21.5-RT; EDM-PN: *; Text2: *; Text1: *
footprint EL-RAD-16x21.5-RT (Capacitor, Electrolytic, THP, Radial, Dia 16.0mm, Pitch 7.50mm)
pins: 1, 2

## 680uF_250V_20%-LGW2E681MELB30
designator C?, comment value 680uF  Voltage: 250V  (hidden comment: LGW2E681MELB30)
Cap Electrolytic THP Radial Snap-In; Manufacturer: Nichicon; Tol: 20%; Part Number: LGW2E681MELB30; Package: EL-RAD-30x30-2PIN-SNAP-IN; EDM-PN: *; Text2: *; Text1: *
footprint EL-RAD-30x30-2PIN-SNAP-IN (Capacitor, Electrolytic, THP, 30x30mm)
pins: 1, 2

## 820uF_6.3V_20%-10x13
designator C?, comment value 820uF  Voltage: 6.3V  (hidden comment: CAP-EL_820uF_6.3V_20%)
Cap Electrolytic THP Radial; Manufacturer: Various; Part Number: 820uF_6.3V_20%(10x13); Tol: 20%; Package: EL-RAD-10x13; EDM-PN: *; Text2: *; Text1: *
footprint EL-RAD-10X13 (Capacitor, Electrolytic, THP, Radial, Dia 10.00mm, Pitch 5.00mm)
pins: 1, 2

## 820uF_350V_20%-MAL209615821E3
designator C?, comment value 820uF  Voltage: 350V  (hidden comment: MAL209615821E3)
Cap Electrolytic THP Radial 4 Lead Snap-in; Manufacturer: Vishay; Tol: 20%; Reutech PN: 5910-EL-0190; Part Number: MAL209615821E3; Package: EL-RAD-35x50-4PIN-SNAP-IN; EDM-PN: *; Text2: *; Text1: *
footprint EL-RAD-35x50-4PIN-SNAP-IN (Capacitor, Electrolytic, THP, 35x50mm)
pins: 1, 2

## 1000uF_6.3V_20%-EXR102M6.3 10x12.5
designator C?, comment value 1000uF  Voltage: 6.3V  (hidden comment: EXR102M6.3 10x12.5)
Cap Electrolytic THP Radial Low Imp; Manufacturer: Hitano; Tol: 20%; Part Number: EXR102M6.3 10x12.5; Package: EL-RAD-10x13; EDM-PN: *; Text2: *; Text1: *
footprint EL-RAD-10X13 (Capacitor, Electrolytic, THP, Radial, Dia 10.00mm, Pitch 5.00mm)
pins: 1, 2

## 1000uF_16V_20%
designator C?, comment value 1000uF  Voltage: 16V  (hidden comment: CAP-EL_1000uF_16V_20%)
Cap Electrolytic THP Radial; Manufacturer: Rubycon; Part Number: 16YK1000M; Tol: 20%; Package: EL-RAD-10x16; EDM-PN: *; Text2: *; Text1: *
footprint EL-RAD-10x16 (Capacitor, Electrolytic, THP, Radial, Dia 10.00mm, Pitch 5.00mm)
pins: 1, 2